# Altium footprint library UAARG Autopilot.PcbLib: 95 footprints (part 1 of 6)
Each footprint in its own frame and in the unit in brackets; x right, y up, seen from the top. Pads: shape width x height; smd on the part's side, far side on the other; paste and mask are expansions set on the pad; w line width, h text height; cw(c..) or ccw(c..) is an arc to the next point about the centre after c.
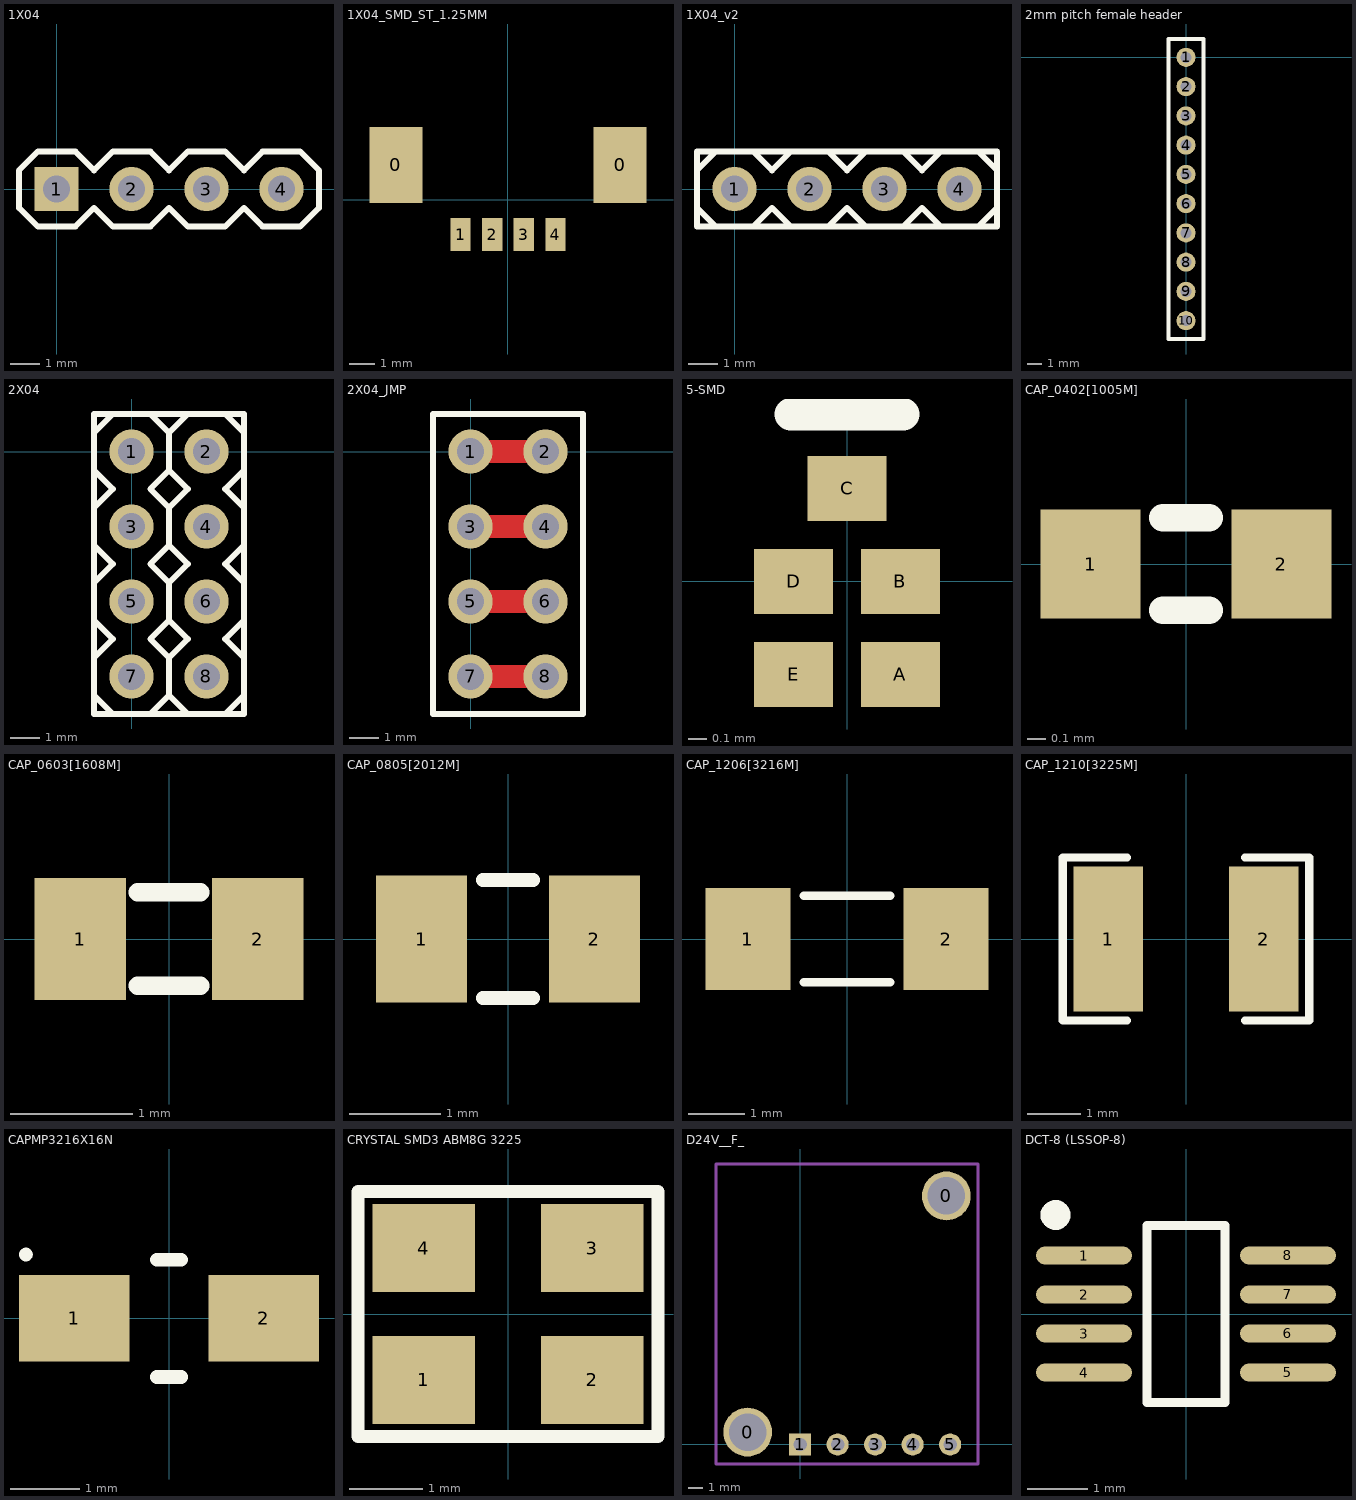
[diagram p0: the footprints below, top view; thin cyan lines are the x and y axes]

## 1X04 [mm] "Connector; Header; 4 Position"
pads (4):
  rect 1.5x1.5 hole 0.9: 1(0,0)
  round 1.5 hole 0.9: 2(2.54,0) 3(5.08,0) 4(7.62,0)
Top Overlay:
  lines w0.203: -1.27,-0.635 -1.27,0.635 -0.635,1.27 0.635,1.27 1.27,0.635 1.905,1.27 3.175,1.27 3.81,0.635 4.445,1.27 5.715,1.27 6.35,0.635 6.985,1.27 8.255,1.27 8.89,0.635 8.89,-0.635 8.255,-1.27 6.985,-1.27 6.35,-0.635 5.715,-1.27 4.445,-1.27 3.81,-0.635 3.175,-1.27 1.905,-1.27 1.27,-0.635 0.635,-1.27 -0.635,-1.27 -1.27,-0.635

## 1X04_SMD_ST_1.25MM [mm] "Connector 1x04, vertical, smd, 1.25mm pitch (footprint compatible with Molex PicoBlade and Hirose DF13 Series)"
height 4.7
pads (6):
  rect 2.1x3 smd: 0(-4.425,1.375) 0(4.425,1.375)
  rect 0.8x1.3 smd: 1(-1.875,-1.375) 2(-0.625,-1.375) 3(0.625,-1.375) 4(1.875,-1.375)
3D body: height 4.8, standoff -0.8, extent -4.825,-1.8 4.825,3.1

## 1X04_v2 [mm] "Connector; Header; 4 Position"
pads (4):
  round 1.5 hole 0.9: 1(0,0) 2(2.54,0) 3(5.08,0) 4(7.62,0)
Top Overlay:
  lines w0.203: -1.27,-1.27 8.89,-1.27 8.89,1.27 -1.27,1.27 -1.27,-1.27 ; -1.27,-0.635 -1.27,0.635 -0.635,1.27 0.635,1.27 1.27,0.635 1.905,1.27 3.175,1.27 3.81,0.635 4.445,1.27 5.715,1.27 6.35,0.635 6.985,1.27 8.255,1.27 8.89,0.635 8.89,-0.635 8.255,-1.27 6.985,-1.27 6.35,-0.635 5.715,-1.27 4.445,-1.27 3.81,-0.635 3.175,-1.27 1.905,-1.27 1.27,-0.635 0.635,-1.27 -0.635,-1.27 -1.27,-0.635

## 2mm pitch female header [mm] "2mm pitch female header"
pads (10):
  round 1.3 hole 0.762: 1(0,0) 2(0,-2) 3(0,-4) 4(0,-6) 5(0,-8) 6(0,-10) 7(0,-12) 8(0,-14) 9(0,-16) 10(0,-18)
Top Overlay:
  lines w0.254: 1.19,1.19 1.19,-19.254 -1.19,-19.254 -1.19,1.246 -1.183,1.254 1.19,1.254
3D body: height 4, standoff -2.8, extent -1.227,-19.254 1.273,1.246

## 2X04 [mm] "Connector; Header; 4 Position"
pads (8):
  round 1.5 hole 0.9: 1(0,0) 2(2.54,0) 3(0,-2.54) 4(2.54,-2.54) 5(0,-5.08) 6(2.54,-5.08) 7(0,-7.62) 8(2.54,-7.62)
Top Overlay:
  lines w0.203: 1.27,-8.255 1.27,-6.985 ; 1.27,-8.255 1.905,-8.89 3.175,-8.89 3.81,-8.255 3.81,-6.985 3.175,-6.35 3.81,-5.715 3.81,-4.445 3.175,-3.81 3.81,-3.175 3.81,-1.905 3.175,-1.27 3.81,-0.635 3.81,0.635 3.175,1.27 1.905,1.27 1.27,0.635 ; 1.27,-8.255 0.635,-8.89 -0.635,-8.89 -1.27,-8.255 -1.27,-6.985 -0.635,-6.35 -1.27,-5.715 -1.27,-4.445 -0.635,-3.81 -1.27,-3.175 -1.27,-1.905 -0.635,-1.27 -1.27,-0.635 -1.27,0.635 -0.635,1.27 0.635,1.27 1.27,0.635 ; 1.27,-8.255 1.27,-6.985 ; 1.27,-6.985 1.905,-6.35 1.27,-5.715 ; 1.27,-6.985 0.635,-6.35 1.27,-5.715 ; 1.27,-5.715 1.27,-4.445 ; 1.27,-5.715 1.27,-4.445 ; 1.27,-4.445 1.905,-3.81 1.27,-3.175 ; 1.27,-4.445 0.635,-3.81 1.27,-3.175 ; 1.27,-3.175 1.27,-1.905 ; 1.27,-3.175 1.27,-1.905 ; 1.27,-1.905 1.905,-1.27 1.27,-0.635 ; 1.27,-1.905 0.635,-1.27 1.27,-0.635 ; 1.27,-0.635 1.27,0.635 ; 1.27,-0.635 1.27,0.635 ; -1.27,-8.89 -1.27,1.27 1.27,1.27 3.81,1.27 3.81,-8.89 1.27,-8.89 -1.27,-8.89

## 2X04_JMP [mm] "Connector; Header; 4 Position,, jumper SMD"
pads (8):
  round 1.5 hole 0.9: 1(0,0) 2(2.54,0) 3(0,-2.54) 4(2.54,-2.54) 5(0,-5.08) 6(2.54,-5.08) 7(0,-7.62) 8(2.54,-7.62)
Top Layer:
  region: 0.635,-7.239 0.635,-8.001 1.93,-8.001 1.93,-7.239
  region: 0.635,-4.699 0.635,-5.461 1.93,-5.461 1.93,-4.699
  region: 0.635,-2.159 0.635,-2.921 1.93,-2.921 1.93,-2.159
  region: 0.635,0.381 0.635,-0.381 1.93,-0.381 1.93,0.381
Bottom Layer:
  region: 0.635,-8.001 0.635,-7.239 1.93,-7.239 1.93,-8.001
  region: 0.635,-5.461 0.635,-4.699 1.93,-4.699 1.93,-5.461
  region: 0.635,-2.921 0.635,-2.159 1.93,-2.159 1.93,-2.921
  region: 0.635,-0.381 0.635,0.381 1.93,0.381 1.93,-0.381
Top Overlay:
  lines w0.203: -1.27,-8.89 1.27,-8.89 3.81,-8.89 3.81,1.27 1.27,1.27 -1.27,1.27 -1.27,-8.89
Top Solder:
  rectangle: 0.481,-8.128 1.956,-7.112
  rectangle: 0.481,-5.588 1.956,-4.572
  rectangle: 0.481,-3.048 1.956,-2.032
  rectangle: 0.481,-0.508 1.956,0.508
Bottom Solder:
  rectangle: 0.481,-8.128 1.956,-7.112
  rectangle: 0.481,-5.588 1.956,-4.572
  rectangle: 0.481,-3.048 1.956,-2.032
  rectangle: 0.481,-0.508 1.956,0.508

## 5-SMD [mm] "5-Terminal Surface-Mount Case  1.45 X 1.15- mm Nominal Footprint"
height 0.7
pads (5):
  rect 0.425x0.35 smd: A(0.288,-0.5) B(0.288,0) C(0,0.5) D(-0.288,0) E(-0.288,-0.5)
Top Overlay:
  lines w0.178: -0.3,0.9 0.3,0.9
3D body: height 0.7, standoff 0, extent -0.575,-0.725 0.575,0.725

## CAP_0402[1005M] [mm] "Chip SMD Capacitor, Body 1.0x0.5mm, IPC Low Density"
height 0.4
pads (2):
  rect 0.55x0.6 smd: 1(-0.525,0) 2(0.525,0)
Top Overlay:
  lines w0.152: -0.127,-0.254 0.127,-0.254 ; -0.127,0.254 0.127,0.254
3D body: height 0.48, standoff -0.02, extent -0.5,-0.25 0.5,0.25

## CAP_0603[1608M] [mm] "Chip SMD Capacitor, Body 1.6x0.8mm, IPC Low Density"
height 0.6
pads (2):
  rect 0.75x1 smd: 1(-0.725,0) 2(0.725,0)
Top Overlay:
  lines w0.152: -0.254,-0.381 0.254,-0.381 ; -0.254,0.381 0.254,0.381
3D body: height 0.78, standoff -0.02, extent -0.8,-0.4 0.8,0.4

## CAP_0805[2012M] [mm] "Chip SMD Capacitor, Body 2.0x1.2mm, IPC Low Density"
height 0.65
pads (2):
  rect 1x1.4 smd: 1(-0.95,0) 2(0.95,0)
Top Overlay:
  lines w0.152: -0.275,-0.65 0.275,-0.65 ; -0.275,0.65 0.275,0.65
3D body: height 0.59, standoff -0.01, extent -1,-0.625 1,0.625

## CAP_1206[3216M] [mm] "Chip SMD Capacitor, Body 3.2x1.6mm, IPC Low Density"
height 0.71
pads (2):
  rect 1.5x1.8 smd: 1(-1.75,0) 2(1.75,0)
Top Overlay:
  lines w0.152: -0.762,-0.762 0.762,-0.762 ; -0.762,0.762 0.762,0.762
3D body: height 0.76, standoff -0.02, extent -1.6,-0.8 1.6,0.8

## CAP_1210[3225M] [mm] "Chip SMD Capacitor, Body 3.2x2.5mm, IPC Low Density"
height 0.71
pads (2):
  rect 1.3x2.7 smd: 1(-1.45,0) 2(1.45,0)
Top Overlay:
  lines w0.152: -1.1,-1.524 -2.3,-1.524 -2.3,1.524 -1.1,1.524 ; 1.1,-1.524 2.3,-1.524 2.3,1.524 1.1,1.524
3D body: height 1.3, standoff 0, extent -1.6,-1.25 1.6,1.25

## CAPMP3216X16N [mm] "Molded Capacitor, 2-Leads, Body 3.20x1.60mm, IPC Medium Density"
height 1.6
pads (2):
  rect 1.6x1.25 smd: 1(-1.375,0) 2(1.375,0)
Top Overlay:
  circle w0.1: c-2.075,0.925 r0.05
  lines w0.2: -0.175,-0.85 0.175,-0.85 ; -0.175,0.85 0.175,0.85
3D body: height 1.71, standoff 0, extent -1.7,-0.84 1.7,0.84

## CRYSTAL SMD3 ABM8G 3225 [mm] "SMD Crystal Abracon ABM8G 3.2x2.5"
height 1
pads (4):
  rect 1.4x1.2 smd: 1(-1.15,-0.9) 2(1.15,-0.9) 3(1.15,0.9) 4(-1.15,0.9)
Top Overlay:
  lines w0.178: -2.05,-1.675 2.05,-1.675 2.05,1.675 -2.05,1.675 -2.05,-1.675
3D body: height 1.01, standoff 0, extent -1.6,-1.25 1.6,1.25

## D24V__F_ [mm] "Pololu's Buck Converter Module"
pads (7):
  round 3.302 hole 2.54: 0(-3.556,0.838) 0(9.906,16.84)
  rect 1.5x1.5 hole 0.9: 1(0,0)
  round 1.5 hole 0.9: 2(2.54,0) 3(5.08,0) 4(7.62,0) 5(10.16,0)
Mechanical 15:
  lines w0.203: -5.715,-1.321 -5.715,18.999 12.065,18.999 12.065,-1.321 -5.715,-1.321

## DCT-8 (LSSOP-8) [mm] "LSSOP-8, 8-Leads, Body 3.15x2.9mm, Pitch 0.65mm, IPC Medium Density"
height 1.3
pads (8):
  oval 1.6x0.3 smd: 1(-1.7,0.975) 2(-1.7,0.325) 3(-1.7,-0.325) 4(-1.7,-0.975) 5(1.7,-0.975) 6(1.7,-0.325) 7(1.7,0.325) 8(1.7,0.975)
Top Overlay:
  circle w0.25: c-2.175,1.65 r0.125
  lines w0.152: -0.65,-1.475 -0.65,1.475 0.65,1.475 0.65,-1.475 -0.65,-1.475
3D body: height 1.3, standoff 0, extent -2.1,-1.525 2.1,1.525